# Altium integrated library micromouse library[Conflict].IntLib: 68 symbols (continued)
## MK20DX256VLH7_1
designator ?, comment MK20DX256VLH7
Kinetis K20: 72MHz Cortex-M4 Performance MCU, 288KB Flash, 64KB SRAM, Full-Speed USB, 64-LQFP; MF: NXP USA; Package: LQFP-64 NXP Semiconductors; Availability: Unavailable; MP: MK20DX256VLH7; SnapEDA_Link: https://www.snapeda.com/parts/MK20DX256VLH7/NXP%20USA%20Inc./view-part/?ref=snap; Price: None; Value: *
footprint QFP50P1200X1200X160-64N
pins: 1 D31/A20 (io), 2 D26/A15 (io), 3 VCC (io), 4 VSS (io), 5 USB-P (io), 6 USB-M (io), 7 VOUT3V3 (io), 8 VREGIN (io), 9 A11/ADC0_DP0 (io), 10 A10/ADC0_DM0 (io), 11 A12/ADC0_DP3 (io), 12 A13/ADC0_DM3 (io), 13 VCCA (io), 14 VREF-H (io), 15 VREF-L (io), 16 VSSA (io), 17 VREF_OUT (io), 18 A14/DAC (io), 19 XTAL32 (io), 20 EXTAL32 (io), 21 VBAT (io), 22 PTA0 (io), 23 PTA1 (io), 24 PTA2 (io), 25 PTA3 (io), 26 D33/PWM/TOUCH (io), 27 D24 (io), 28 D3/CAN-TX/PWM (io), 29 D4/CAN-RX/PWM (io), 30 VCC (io), 31 VSS (io), 32 OSC1 (io), 33 OSC2 (io), 34 RESET (io), 35 D16/A2/TOUCH (io), 36 D17/A3/TOUCH (io), 37 D19/A5/SCL0/TOUCH (io), 38 D18/A4/SDA0/TOUCH (io), 39 D0/RX1/TOUCH (io), 40 D1/TX1/TOUCH (io), 41 D32/PWM/TOUCH (io), 42 D25/PWM/TOUCH (io), 43 D15/A1/TOUCH (io), 44 D22/A8/PWM/TOUCH (io), 45 D23/A9/PWM/TOUCH (io), 46 D9/RX2/PWM (io), 47 VSS (io), 48 VCC (io), 49 D10/TX2/PWM (io), 50 D13/SCK/LED (io), 51 D11/MOSI (io), 52 D12/MISO (io), 53 D28/A17 (io), 54 D27/A16 (io), 55 D29/A18/SCL1 (io), 56 D30/A19/SDA1 (io), 57 D2 (io), 58 D14/A0 (io), 59 D7/RX3 (io), 60 D8/TX3 (io), 61 D6/PWM (io), 62 D20/A6/PWM (io), 63 D21/A7/PWM (io), 64 D5/PWM (io)

## MK64FX512VDC12
designator IC?
Integrated Circuit; Manufacturer_Name: Nexperia; Manufacturer_Part_Number: MK64FX512VDC12; Datasheet Link: https://www.nxp.com/docs/en/data-sheet/K64P144M120SF5.pdf; Height: 0.5mm; Mouser Part Number: 841-MK64FX512VDC12; Mouser Price/Stock: https://www.mouser.com/Search/Refine.aspx?Keyword=841-MK64FX512VDC12
footprint BGA121C65P11X11_800X800X50
pins: A1 PTD7, A2 PTD5, A3 PTD4/_LLWU_P14, A4 PTC19, A5 PTC14, A6 PTC13, A7 PTC8, A8 PTC4/_LLWU_P8, A9 PTD9, A10 PTD8, A11 NC_1, B1 PTD10, B2 PTD6/_LLWU_P15, B3 PTD3, B4 PTC18, B5 PTC15, B6 PTC12, B7 PTC7, B8 PTC3/_LLWU_P7, B9 PTC0, B10 PTB16, B11 PTB12, C1 PTD12, C2 PTD11, C3 PTD2/_LLWU_P13, C4 PTC17, C5 PTC11/_LLWU_P11, C6 PTC10, C7 PTC6/_LLWU_P10, C8 PTC2, C9 PTB19, C10 PTB11, C11 PTB13, D1 PTD14, D2 PTD13, D3 PTD1, D4 PTD0/_LLWU_P12, D5 PTC16, D6 PTC9, D7 PTC5/_LLWU_P9, D8 PTC1/_LLWU_P6, D9 PTB18, D10 PTB10, D11 PTB8, E1 PTD15, E2 PTE2/_LLWU_P1, E3 PTE1/_LLWU_P0, E4 PTE0, E5 VDD_1, E6 VDD_2, E7 VDD_3, E8 PTB23, E9 PTB17, E10 PTB9, E11 PTB7, F1 USB0_DP, F2 USB0_DM, F3 PTE6, F4 PTE3, F5 VDDA, F6 VSSA, F7 VSS_1, F8 PTB22, F9 PTB21, F10 PTB20, F11 PTB6, G1 VOUT33, G2 VREGIN, G3 VSS_2, G4 PTE5, G5 VREFH, G6 VREFL, G7 VSS_3, G8 PTB3, G9 PTB2, G10 PTB1, G11 PTB0/_LLWU_P5, H1 ADC0_DP1, H2 ADC0_DM1, H3 ADC0_SE16/_CMP1_IN2/_ADC0_SE21, H4 NC_2, H5 PTE24, H6 PTE26, H7 PTE4/_LLWU_P2, H8 PTA1, H9 PTA3, H10 PTA17, H11 PTA29, J1 ADC1_DP1, J2 ADC1_DM1, J3 ADC1_SE16/_CMP2_IN2/_ADC0_SE22, J4 PTA11, J5 PTE25, J6 PTA0, J7 PTA2, J8 PTA4/_LLWU_P3, J9 PTA10, J10 PTA16, J11 RESET_B, K1 ADC0_DP0/_ADC1_DP3, K2 ADC0_DM0/_ADC1_DM3, K3 NC_3, K4 DAC1_OUT/_CMP0_IN4/_CMP2_IN3/_ADC1_SE23, K5 DAC0_OUT/_CMP1_IN3/_ADC0_SE23, K6 VBAT, K7 PTA5, K8 PTA12, K9 PTA14, K10 VSS_4, K11 PTA19, L1 ADC1_DP0/_ADC0_DP3, L2 ADC1_DM0/_ADC0_DM3, L3 VREF_OUT/_CMP1_IN5/_CMP0_IN5/_ADC1_SE18, L4 XTAL32, L5 EXTAL32, L6 VSS_5, L7 RTC__WAKEUP_B, L8 PTA13/_LLWU_P4, L9 PTA15, L10 VDD_4, L11 PTA18

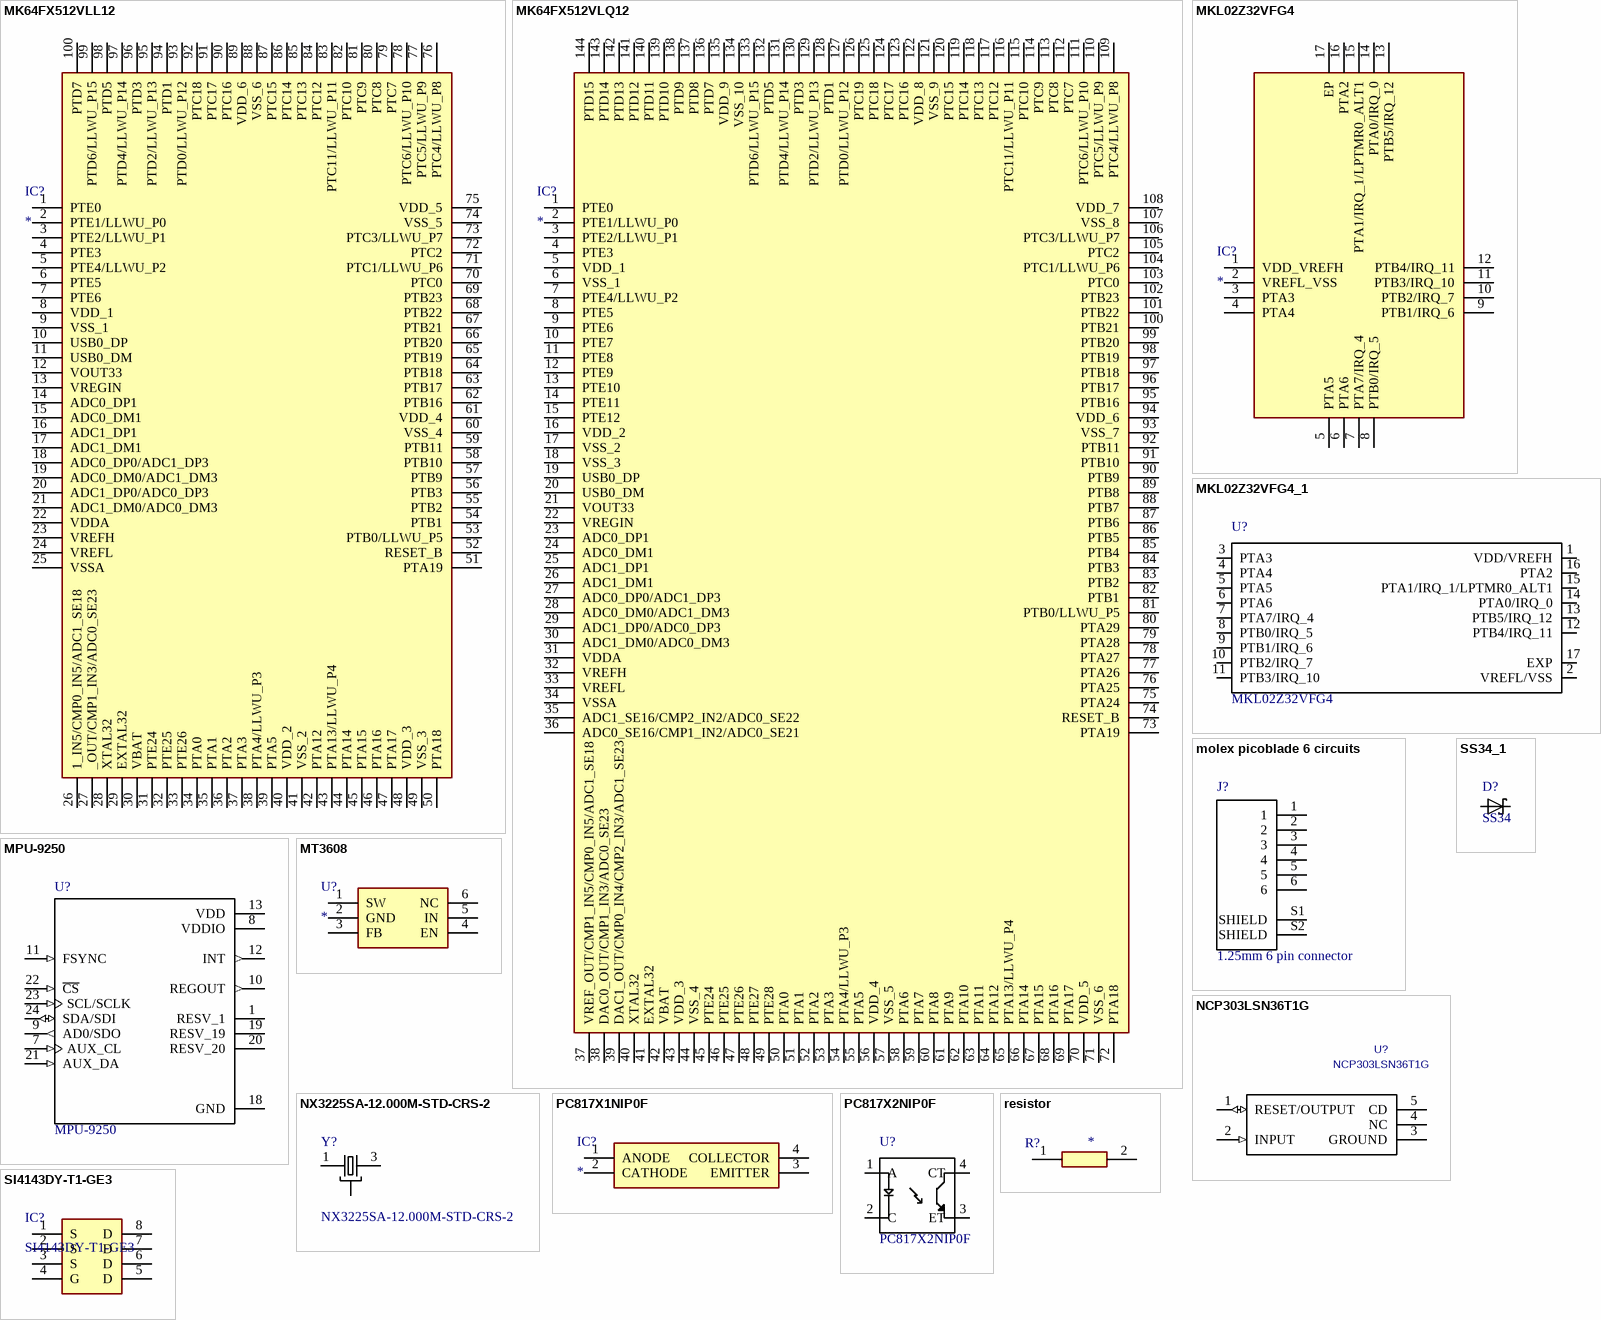
[diagram p2: symbols MK64FX512VLL12 to SS34_1]

## MK64FX512VLL12
designator IC?
Integrated Circuit; Manufacturer_Name: Nexperia; Manufacturer_Part_Number: MK64FX512VLL12; Datasheet Link: https://componentsearchengine.com/Datasheets/1/MK64FX512VLL12.pdf; Height: 1.7mm; Mouser Part Number: 841-MK64FX512VLL12; Mouser Price/Stock: https://www.mouser.com/Search/Refine.aspx?Keyword=841-MK64FX512VLL12
footprint QFP50P1600X1600X170-100N
pins: 1 PTE0, 2 PTE1/LLWU_P0, 3 PTE2/LLWU_P1, 4 PTE3, 5 PTE4/LLWU_P2, 6 PTE5, 7 PTE6, 8 VDD_1, 9 VSS_1, 10 USB0_DP, 11 USB0_DM, 12 VOUT33, 13 VREGIN, 14 ADC0_DP1, 15 ADC0_DM1, 16 ADC1_DP1, 17 ADC1_DM1, 18 ADC0_DP0/ADC1_DP3, 19 ADC0_DM0/ADC1_DM3, 20 ADC1_DP0/ADC0_DP3, 21 ADC1_DM0/ADC0_DM3, 22 VDDA, 23 VREFH, 24 VREFL, 25 VSSA, 26 1_IN5/CMP0_IN5/ADC1_SE18, 27 _OUT/CMP1_IN3/ADC0_SE23, 28 XTAL32, 29 EXTAL32, 30 VBAT, 31 PTE24, 32 PTE25, 33 PTE26, 34 PTA0, 35 PTA1, 36 PTA2, 37 PTA3, 38 PTA4/LLWU_P3, 39 PTA5, 40 VDD_2, 41 VSS_2, 42 PTA12, 43 PTA13/LLWU_P4, 44 PTA14, 45 PTA15, 46 PTA16, 47 PTA17, 48 VDD_3, 49 VSS_3, 50 PTA18, 51 PTA19, 52 RESET_B, 53 PTB0/LLWU_P5, 54 PTB1, 55 PTB2, 56 PTB3, 57 PTB9, 58 PTB10, 59 PTB11, 60 VSS_4, 61 VDD_4, 62 PTB16, 63 PTB17, 64 PTB18, 65 PTB19, 66 PTB20, 67 PTB21, 68 PTB22, 69 PTB23, 70 PTC0, 71 PTC1/LLWU_P6, 72 PTC2, 73 PTC3/LLWU_P7, 74 VSS_5, 75 VDD_5, 76 PTC4/LLWU_P8, 77 PTC5/LLWU_P9, 78 PTC6/LLWU_P10, 79 PTC7, 80 PTC8, 81 PTC9, 82 PTC10, 83 PTC11/LLWU_P11, 84 PTC12, 85 PTC13, 86 PTC14, 87 PTC15, 88 VSS_6, 89 VDD_6, 90 PTC16, 91 PTC17, 92 PTC18, 93 PTD0/LLWU_P12, 94 PTD1, 95 PTD2/LLWU_P13, 96 PTD3, 97 PTD4/LLWU_P14, 98 PTD5, 99 PTD6/LLWU_P15, 100 PTD7

## MK64FX512VLQ12
designator IC?
Integrated Circuit; Manufacturer_Name: Nexperia; Manufacturer_Part_Number: MK64FX512VLQ12; Datasheet Link: https://www.nxp.com/docs/en/data-sheet/K64P144M120SF5.pdf; Height: 1.6mm; Mouser Part Number: 841-MK64FX512VLQ12; Mouser Price/Stock: https://www.mouser.com/Search/Refine.aspx?Keyword=841-MK64FX512VLQ12
footprint QFP50P2200X2200X160-144N
pins: 1 PTE0, 2 PTE1/LLWU_P0, 3 PTE2/LLWU_P1, 4 PTE3, 5 VDD_1, 6 VSS_1, 7 PTE4/LLWU_P2, 8 PTE5, 9 PTE6, 10 PTE7, 11 PTE8, 12 PTE9, 13 PTE10, 14 PTE11, 15 PTE12, 16 VDD_2, 17 VSS_2, 18 VSS_3, 19 USB0_DP, 20 USB0_DM, 21 VOUT33, 22 VREGIN, 23 ADC0_DP1, 24 ADC0_DM1, 25 ADC1_DP1, 26 ADC1_DM1, 27 ADC0_DP0/ADC1_DP3, 28 ADC0_DM0/ADC1_DM3, 29 ADC1_DP0/ADC0_DP3, 30 ADC1_DM0/ADC0_DM3, 31 VDDA, 32 VREFH, 33 VREFL, 34 VSSA, 35 ADC1_SE16/CMP2_IN2/ADC0_SE22, 36 ADC0_SE16/CMP1_IN2/ADC0_SE21, 37 VREF_OUT/CMP1_IN5/CMP0_IN5/ADC1_SE18, 38 DAC0_OUT/CMP1_IN3/ADC0_SE23, 39 DAC1_OUT/CMP0_IN4/CMP2_IN3/ADC1_SE23, 40 XTAL32, 41 EXTAL32, 42 VBAT, 43 VDD_3, 44 VSS_4, 45 PTE24, 46 PTE25, 47 PTE26, 48 PTE27, 49 PTE28, 50 PTA0, 51 PTA1, 52 PTA2, 53 PTA3, 54 PTA4/LLWU_P3, 55 PTA5, 56 VDD_4, 57 VSS_5, 58 PTA6, 59 PTA7, 60 PTA8, 61 PTA9, 62 PTA10, 63 PTA11, 64 PTA12, 65 PTA13/LLWU_P4, 66 PTA14, 67 PTA15, 68 PTA16, 69 PTA17, 70 VDD_5, 71 VSS_6, 72 PTA18, 73 PTA19, 74 RESET_B, 75 PTA24, 76 PTA25, 77 PTA26, 78 PTA27, 79 PTA28, 80 PTA29, 81 PTB0/LLWU_P5, 82 PTB1, 83 PTB2, 84 PTB3, 85 PTB4, 86 PTB5, 87 PTB6, 88 PTB7, 89 PTB8, 90 PTB9, 91 PTB10, 92 PTB11, 93 VSS_7, 94 VDD_6, 95 PTB16, 96 PTB17, 97 PTB18, 98 PTB19, 99 PTB20, 100 PTB21, 101 PTB22, 102 PTB23, 103 PTC0, 104 PTC1/LLWU_P6, 105 PTC2, 106 PTC3/LLWU_P7, 107 VSS_8, 108 VDD_7, 109 PTC4/LLWU_P8, 110 PTC5/LLWU_P9, 111 PTC6/LLWU_P10, 112 PTC7, 113 PTC8, 114 PTC9, 115 PTC10, 116 PTC11/LLWU_P11, 117 PTC12, 118 PTC13, 119 PTC14, 120 PTC15, 121 VSS_9, 122 VDD_8, 123 PTC16, 124 PTC17, 125 PTC18, 126 PTC19, 127 PTD0/LLWU_P12, 128 PTD1, 129 PTD2/LLWU_P13, 130 PTD3, 131 PTD4/LLWU_P14, 132 PTD5, 133 PTD6/LLWU_P15, 134 VSS_10, 135 VDD_9, 136 PTD7, 137 PTD8, 138 PTD9, 139 PTD10, 140 PTD11, 141 PTD12, 142 PTD13, 143 PTD14, 144 PTD15

## MKL02Z32VFG4
designator IC?
Integrated Circuit; Manufacturer_Name: Nexperia; Manufacturer_Part_Number: MKL02Z32VFG4; Datasheet Link: https://www.nxp.com/docs/en/data-sheet/KL02P32M48SF0.pdf; Height: 0.65mm; Mouser Part Number: 841-MKL02Z32VFG4; Mouser Price/Stock: https://www.mouser.com/Search/Refine.aspx?Keyword=841-MKL02Z32VFG4; RS Part Number: 7884723P; RS Price/Stock: http://uk.rs-online.com/web/p/products/7884723P
footprint QFN50P300X300X65-17N-D
pins: 1 VDD_VREFH, 2 VREFL_VSS, 3 PTA3, 4 PTA4, 5 PTA5, 6 PTA6, 7 PTA7/IRQ_4, 8 PTB0/IRQ_5, 9 PTB1/IRQ_6, 10 PTB2/IRQ_7, 11 PTB3/IRQ_10, 12 PTB4/IRQ_11, 13 PTB5/IRQ_12, 14 PTA0/IRQ_0, 15 PTA1/IRQ_1/LPTMR0_ALT1, 16 PTA2, 17 EP

## MKL02Z32VFG4_1
designator U?, comment MKL02Z32VFG4
32 Bit Microcontroller, Kinetis L Series Ultra Low Power, ARM Cortex-M0+, 48 MHz, 32 KB, 4 KB, 16; MF: NXP USA; Package: QFN-16 NXP Semiconductors; Availability: Unavailable; MP: MKL02Z32VFG4; SnapEDA_Link: https://www.snapeda.com/parts/MKL02Z32VFG4/NXP%20USA%20Inc./view-part/?ref=snap; Price: None; Value: *
footprint *QFN50P300X300X65-17N
pins: 1 VDD/VREFH (power), 2 VREFL/VSS (power), 3 PTA3 (io), 4 PTA4 (io), 5 PTA5 (io), 6 PTA6 (io), 7 PTA7/IRQ_4 (io), 8 PTB0/IRQ_5 (io), 9 PTB1/IRQ_6 (io), 10 PTB2/IRQ_7 (io), 11 PTB3/IRQ_10 (io), 12 PTB4/IRQ_11 (io), 13 PTB5/IRQ_12 (io), 14 PTA0/IRQ_0 (io), 15 PTA1/IRQ_1/LPTMR0_ALT1 (io), 16 PTA2 (io), 17 EXP (power)

## molex picoblade 6 circuits
designator J?, comment 1.25mm 6 pin connector
1.25mm _.049_ Pitch PicoBlade Header, Surface Mount, Right Angle, Lead-free, 6 Circuits; MP: 0532610671; MF: Molex; SnapEDA_Link: https://www.snapeda.com/parts/0532610671/Molex/view-part/?ref=snap; Price: None; Package: None; Availability: Unavailable; Value: *
footprint *MOLEX_0532610671_0532610671(Primary)
pins: 1, 2, 3, 4, 5, 6, S1 SHIELD, S2 SHIELD

## MPU-9250
designator U?
IMUs - Inertial Measurement Units RECOMMENDED ALT 410-ICM-20948; MF: TDK InvenSense; Package: TFQFN-24 TDK InvenSense; Availability: Unavailable; MP: MPU-9250; SnapEDA_Link: https://www.snapeda.com/parts/MPU-9250/TDK%20InvenSense/view-part/?ref=snap; Price: None; Value: *
footprint *QFN40P300X300X105-24N
pins: 1 RESV_1, 7 AUX_CL (in), 8 VDDIO (power), 9 AD0/SDO (out), 10 REGOUT (out), 11 FSYNC (in), 12 INT (out), 13 VDD (power), 18 GND (power), 19 RESV_19, 20 RESV_20, 21 AUX_DA (in), 22 ~{CS} (in), 23 SCL/SCLK (in), 24 SDA/SDI (io)

## MT3608
designator U?
Undefined or Miscellaneous; Manufacturer_Name: Aerosemi; Manufacturer_Part_Number: MT3608; Datasheet Link: https://www.olimex.com/Products/Breadboarding/BB-PWR-3608/resources/MT3608.pdf; Height: 1.45mm
footprint SOT95P280X145-6N
pins: 1 SW, 2 GND, 3 FB, 4 EN, 5 IN, 6 NC

## NCP303LSN36T1G
designator U?
C: Copyright (C) 2016 Accelerated Designs. All rights reserved; Vendor: ON Semiconductor; Value: NCP303LSN36T1G; Manufacturer_Part_Number: NCP303LSN36T1G; Copyright: Copyright (C) 2016 Accelerated Designs. All rights reserved
footprint TSOP-5
pins: 1 RESET/OUTPUT (io), 2 INPUT (in), 3 GROUND (power), 4 NC, 5 CD

## NX3225SA-12.000M-STD-CRS-2
designator Y?
Crystal 12.0000mhz 8pf Smd; MF: NDK America,; MP: NX3225SA-12.000M-STD-CRS-2; Price: None; SnapEDA_Link: https://www.snapeda.com/parts/NX3225SA-12.000M-STD-CRS-2/NDK%20America%2C%20Inc./view-part/?ref=snap; Availability: Unavailable; Package: SMD-4 NDK America; Value: *
footprint *OSCCC320X250X60N
pins: 1, 2 GND, 3, 4 GND

## PC817X1NIP0F
designator IC?
Integrated Circuit; Manufacturer_Name: Sharp Microelectronics; Manufacturer_Part_Number: PC817X1NIP0F; Datasheet Link: http://docs-emea.rs-online.com/webdocs/1327/0900766b81327ad8.pdf; Height: 4mm; Mouser Part Number: N/A; Mouser Price/Stock: https://www.mouser.com/Search/Refine.aspx?Keyword=N%2FA; RS Part Number: 8264647P; RS Price/Stock: http://uk.rs-online.com/web/p/products/8264647P
footprint SOP254P975X400-4N
pins: 1 ANODE, 2 CATHODE, 3 EMITTER, 4 COLLECTOR

## PC817X2NIP0F
designator U?
Optocoupler DC-IN 1-CH Transistor DC-OUT 4-Pin PDIP SMD; MF: Sharp Microelectronics; Package: SMD-4 Sharp; Price: None; SnapEDA_Link: https://www.snapeda.com/parts/PC817X2NIP0F/Sharp%20Microelectronics/view-part/?ref=snap; MP: PC817X2NIP0F; Availability: Unavailable; Value: *
footprint *SOT254P975X400-4N
pins: 1 A, 2 C, 3 ET, 4 CT

## resistor
designator R?
Resistor; value: *
footprint RESC1608X55N
pins: 1, 2

## SI4143DY-T1-GE3
designator IC?
Integrated Circuit
footprint SI4143DY-T1-GE3
pins: 1 S, 2 S, 3 S, 4 G, 5 D, 6 D, 7 D, 8 D (power)

## SS34_1
designator D?, comment SS34
Diode Schottky 40V 3A 2-Pin SMC T/R; MF: ON Semiconductor; MP: SS34; SnapEDA_Link: https://www.snapeda.com/parts/SS34/ON%20Semiconductor/view-part/?ref=snap; Price: None; Package: DO-214AB-214 ON Semiconductor; Availability: Unavailable; Value: *
footprint *SMA
pins: A, C

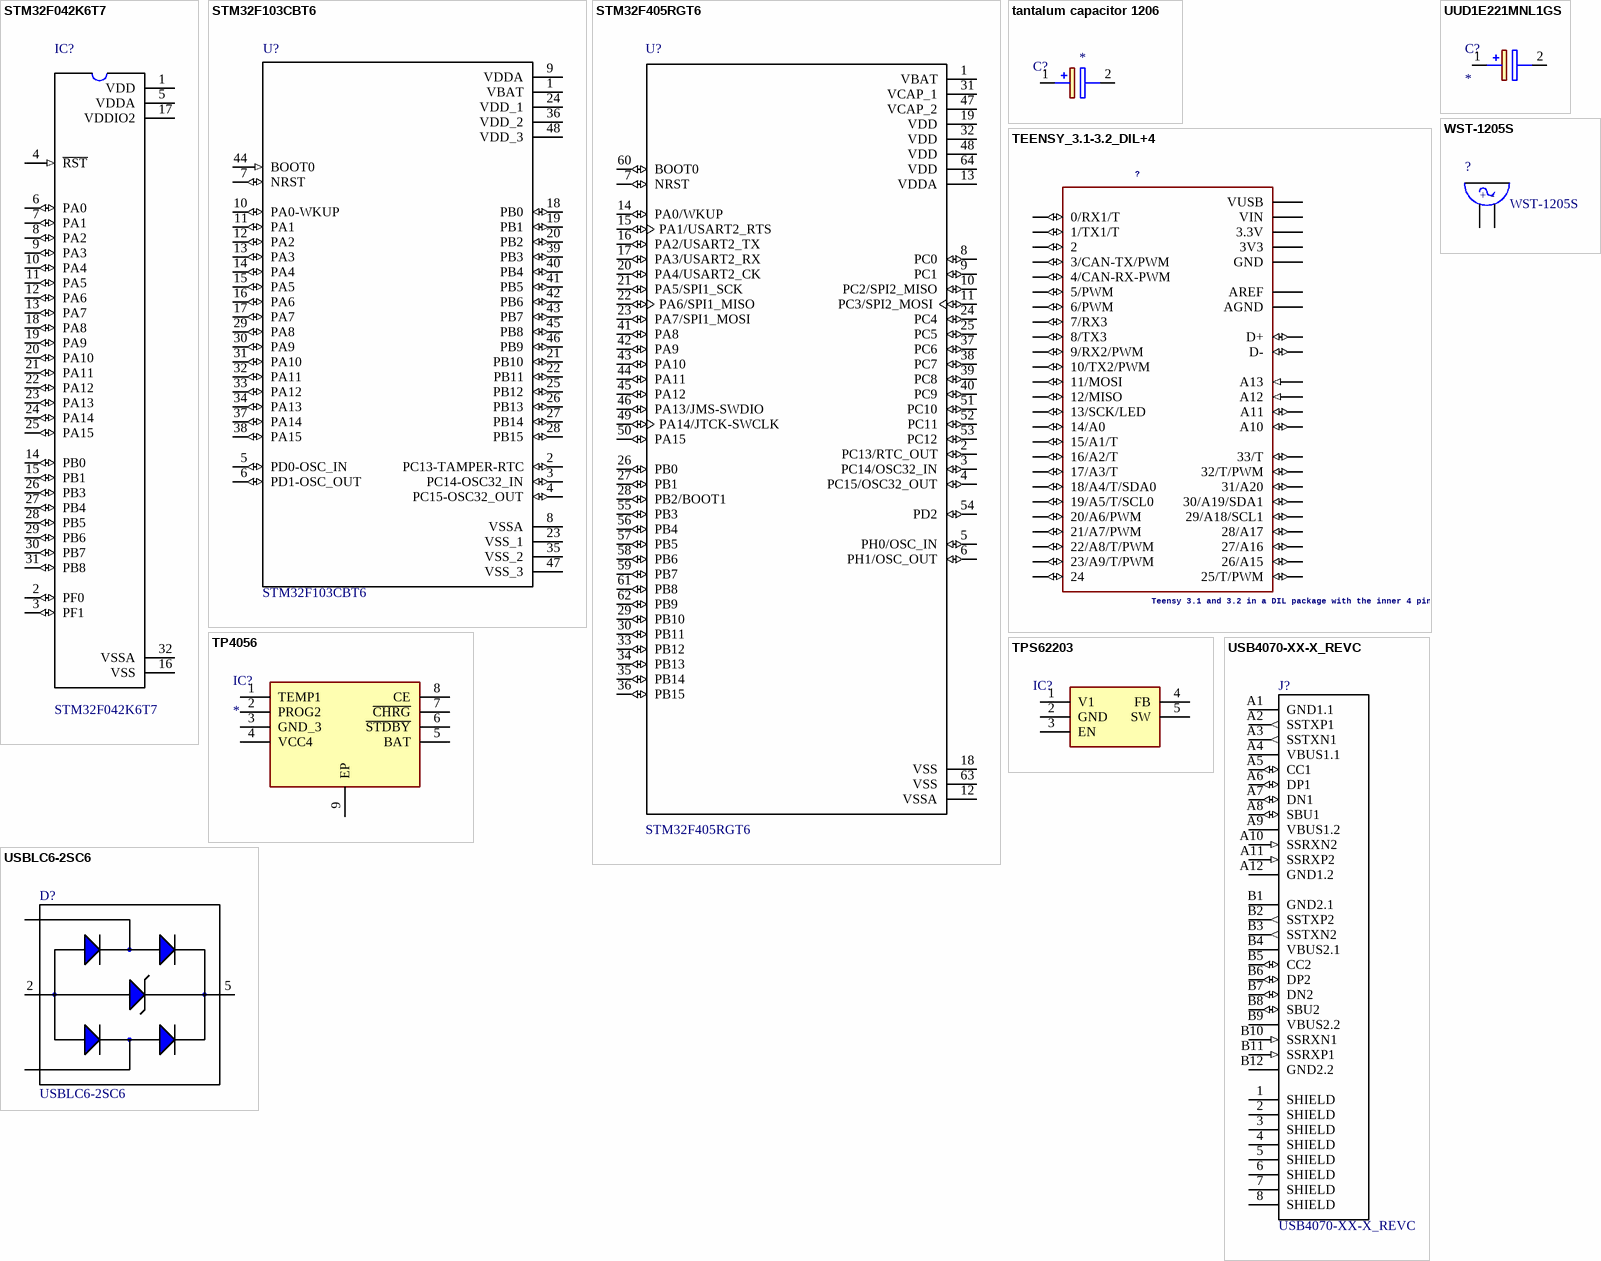
[diagram p3: symbols STM32F042K6T7 to WST-1205S]

## STM32F042K6T7
designator IC?
Entry-level ARM Cortex-M0 USB line MCU with 32 Kbytes Flash, 48 MHz CPU, USB, CAN and CEC functions; MF: STMicroelectronics; MP: STM32F042K6T7; Package: LQFP-32 STMicroelectronics; SnapEDA_Link: https://www.snapeda.com/parts/STM32F042K6T7/STMicroelectronics/view-part/?ref=snap; Price: None; Availability: Unavailable; Value: *
footprint *QFP80P900X900X160-32N
pins: 1 VDD (power), 2 PF0 (io), 3 PF1 (io), 4 ~{RST} (in), 5 VDDA (power), 6 PA0 (io), 7 PA1 (io), 8 PA2 (io), 9 PA3 (io), 10 PA4 (io), 11 PA5 (io), 12 PA6 (io), 13 PA7 (io), 14 PB0 (io), 15 PB1 (io), 16 VSS, 17 VDDIO2 (power), 18 PA8 (io), 19 PA9 (io), 20 PA10 (io), 21 PA11 (io), 22 PA12 (io), 23 PA13 (io), 24 PA14 (io), 25 PA15 (io), 26 PB3 (io), 27 PB4 (io), 28 PB5 (io), 29 PB6 (io), 30 PB7 (io), 31 PB8 (io), 32 VSSA

## STM32F103CBT6
designator U?
Mainstream Performance line, ARM Cortex-M3 MCU with 128 Kbytes Flash, 72 MHz CPU, motor control, USB and CAN; MF: STMicroelectronics; MP: STM32F103CBT6; Price: None; SnapEDA_Link: https://www.snapeda.com/parts/STM32F103CBT6/STMicroelectronics/view-part/?ref=snap; Availability: Unavailable; Package: LQFP-48 STMicroelectronics; Value: *
footprint *QFP50P900X900X160-48N
pins: 1 VBAT (power), 2 PC13-TAMPER-RTC (io), 3 PC14-OSC32_IN (io), 4 PC15-OSC32_OUT (io), 5 PD0-OSC_IN (io), 6 PD1-OSC_OUT (io), 7 NRST (io), 8 VSSA (power), 9 VDDA (power), 10 PA0-WKUP (io), 11 PA1 (io), 12 PA2 (io), 13 PA3 (io), 14 PA4 (io), 15 PA5 (io), 16 PA6 (io), 17 PA7 (io), 18 PB0 (io), 19 PB1 (io), 20 PB2 (io), 21 PB10 (io), 22 PB11 (io), 23 VSS_1 (power), 24 VDD_1 (power), 25 PB12 (io), 26 PB13 (io), 27 PB14 (io), 28 PB15 (io), 29 PA8 (io), 30 PA9 (io), 31 PA10 (io), 32 PA11 (io), 33 PA12 (io), 34 PA13 (io), 35 VSS_2 (power), 36 VDD_2 (power), 37 PA14 (io), 38 PA15 (io), 39 PB3 (io), 40 PB4 (io), 41 PB5 (io), 42 PB6 (io), 43 PB7 (io), 44 BOOT0 (in), 45 PB8 (io), 46 PB9 (io), 47 VSS_3 (power), 48 VDD_3 (power)

## STM32F405RGT6
designator U?
High-performance foundation line, ARM Cortex-M4 core with DSP and FPU, 1 Mbyte Flash, 168 MHz CPU, ART Accelerator; MF: STMicroelectronics; MP: STM32F405RGT6; Price: None; SnapEDA_Link: https://www.snapeda.com/parts/STM32F405RGT6/STMicroelectronics/view-part/?ref=snap; Availability: Unavailable; Package: LQFP-64 STMicroelectronics; Value: *
footprint *QFP50P1200X1200X160-64N
pins: 1 VBAT (power), 2 PC13/RTC_OUT (io), 3 PC14/OSC32_IN (io), 4 PC15/OSC32_OUT (io), 5 PH0/OSC_IN (io), 6 PH1/OSC_OUT (io), 7 NRST (io), 8 PC0 (io), 9 PC1 (io), 10 PC2/SPI2_MISO (io), 11 PC3/SPI2_MOSI (io), 12 VSSA (power), 13 VDDA (power), 14 PA0/WKUP (io), 15 PA1/USART2_RTS (io), 16 PA2/USART2_TX (io), 17 PA3/USART2_RX (io), 18 VSS (power), 19 VDD (power), 20 PA4/USART2_CK (io), 21 PA5/SPI1_SCK (io), 22 PA6/SPI1_MISO (io), 23 PA7/SPI1_MOSI (io), 24 PC4 (io), 25 PC5 (io), 26 PB0 (io), 27 PB1 (io), 28 PB2/BOOT1 (io), 29 PB10 (io), 30 PB11 (io), 31 VCAP_1 (power), 32 VDD (power), 33 PB12 (io), 34 PB13 (io), 35 PB14 (io), 36 PB15 (io), 37 PC6 (io), 38 PC7 (io), 39 PC8 (io), 40 PC9 (io), 41 PA8 (io), 42 PA9 (io), 43 PA10 (io), 44 PA11 (io), 45 PA12 (io), 46 PA13/JMS-SWDIO (io), 47 VCAP_2 (power), 48 VDD (power), 49 PA14/JTCK-SWCLK (io), 50 PA15 (io), 51 PC10 (io), 52 PC11 (io), 53 PC12 (io), 54 PD2 (io), 55 PB3 (io), 56 PB4 (io), 57 PB5 (io), 58 PB6 (io), 59 PB7 (io), 60 BOOT0 (io), 61 PB8 (io), 62 PB9 (io), 63 VSS (power), 64 VDD (power)

## tantalum capacitor 1206
designator C?
Capacitor Polarised; value: *
footprint CAPPM3216X180N
pins: 1 +, 2 -

## TEENSY_3.1-3.2_DIL+4
designator ?, comment Teensy 3.1 and 3.2 in a DIL package with the inner 4 pins
GateName_1: G$1; SymbolName_1: TEENSY_3.1-3.2_DIL+4; LibraryName: Teensy_3_and_LC_Series_Boards_v1.4; DeviceSetName: TEENSY_3.1-3.2_DIL+4; Package: TEENSY_3.0-3.2&LC_DIL+4
footprint TEENSY_3.0-3.2&LC_DIL+4
pins: 0 0/RX1/T (io), 1 1/TX1/T (io), 2 (io), 3 3/CAN-TX/PWM (io), 3.3V (power), 3V 3V3 (power), 4 4/CAN-RX-PWM (io), 5 5/PWM (io), 6 6/PWM (io), 7 7/RX3 (io), 8 8/TX3 (io), 9 9/RX2/PWM (io), 10 10/TX2/PWM (io), 11 11/MOSI (io), 12 12/MISO (io), 13 13/SCK/LED (io), 14/A0 (io), 15/A1 15/A1/T (io), 16/A2 16/A2/T (io), 17/A3 17/A3/T (io), 18/A4 18/A4/T/SDA0 (io), 19/A5 19/A5/T/SCL0 (io), 20/A6 20/A6/PWM (io), 21/A7 21/A7/PWM (io), 22/A8 22/A8/T/PWM (io), 23/A9 23/A9/T/PWM (io), 24 (io), 25 25/T/PWM (io), 26 26/A15 (io), 27 27/A16 (io), 28 28/A17 (io), 29 29/A18/SCL1 (io), 30 30/A19/SDA1 (io), 31 31/A20 (io), 32 32/T/PWM (io), 33 33/T (io), A10 (io), A11 (io), A12 (in), A13 (in), AGND (power), AREF (power), D+ (io), D- (io), GND (power), VIN (power), VUSB (power)

## TP4056
designator IC?
Integrated Circuit; Manufacturer_Name: NanJing Top Power; Manufacturer_Part_Number: TP4056; Datasheet Link: https://dlnmh9ip6v2uc.cloudfront.net/datasheets/Prototyping/TP4056.pdf; Height: 1.75mm
footprint SOIC127P600X175-9N
pins: 1 TEMP1, 2 PROG2, 3 GND_3, 4 VCC4, 5 BAT, 6 ~{STDBY}, 7 ~{CHRG}, 8 CE, 9 EP

## TPS62203
designator IC?  (value not drawn)
Integrated Circuit
footprint SOT95P280X145-5N
pins: 1 V1, 2 GND, 3 EN, 4 FB, 5 SW

## USB4070-XX-X_REVC
designator J?
Usb Type c Rec. 30 , Vertical, Smt With Stakes & Pegs, Tray; MP: USB4070-30-B; MF: Global Connector Technology; SnapEDA_Link: https://www.snapeda.com/parts/USB4070-30-B/Global%20Connector%20Technology/view-part/?ref=snap; Package: None; Price: None; Availability: Unavailable; Value: *
footprint *GCT_USB4070-XX-X_REVC_USB4070-XX-X_REVC(Primary)
pins: 1 SHIELD, 2 SHIELD, 3 SHIELD, 4 SHIELD, 5 SHIELD, 6 SHIELD, 7 SHIELD, 8 SHIELD, A1 GND1.1 (power), A2 SSTXP1 (out), A3 SSTXN1 (out), A4 VBUS1.1 (power), A5 CC1 (io), A6 DP1 (io), A7 DN1 (io), A8 SBU1 (io), A9 VBUS1.2 (power), A10 SSRXN2 (in), A11 SSRXP2 (in), A12 GND1.2 (power), B1 GND2.1 (power), B2 SSTXP2 (out), B3 SSTXN2 (out), B4 VBUS2.1 (power), B5 CC2 (io), B6 DP2 (io), B7 DN2 (io), B8 SBU2 (io), B9 VBUS2.2 (power), B10 SSRXN1 (in), B11 SSRXP1 (in), B12 GND2.2 (power)

## USBLC6-2SC6
designator D?
USBLC6 Series 2 Line 6 V Uni / Bi-Directional ESD Protection - SOT-23-6; MF: STMicroelectronics; Package: SOT-23-6 STMicroelectronics; Price: None; SnapEDA_Link: https://www.snapeda.com/parts/USBLC6-2SC6/STMicroelectronics/view-part/?ref=snap; MP: USBLC6-2SC6; Availability: Unavailable; Value: *
footprint *SOT95P280X145-6N
pins: 1 I/O1 (io), 2 GND (power), 3 I/O2 (io), 4 I/O2 (io), 5 VBUS (power), 6 I/O1 (io)

## UUD1E221MNL1GS
designator C?
Capacitor Polarised; Manufacturer_Name: Nichicon; Manufacturer_Part_Number: UUD1E221MNL1GS; Allied_Number: 70409814; Datasheet Link: https://www.mouser.com/datasheet/2/293/e-uud-1513238.pdf; Height: 10.5mm; Mouser1 Part Number: 647-UUD1E221MNL; Mouser1 Price/Stock: https://www.mouser.com/Search/Refine.aspx?Keyword=647-UUD1E221MNL; RS Part Number: 7393453P; RS Price/Stock: http://uk.rs-online.com/web/p/products/7393453P; Allied Price/Stock: https://www.alliedelec.com/nichicon-uud1e221mnl1gs/70409814/
footprint CAPAE830X1050N
pins: 1 +, 2 -

## WST-1205S
designator ?
Buzzer 2.3khz 4-6vdc Pcb Wash; MF: Soberton Inc.; Price: None; Package: Soberton Inc.; MP: WST-1205S; Availability: Unavailable; SnapEDA_Link: https://www.snapeda.com/parts/WST-1205S/Soberton%20Inc./view-part/?ref=snap; Value: *
footprint *WST-1205S_WST-1205S(Primary)
pins: NEG 2, POS 1
text: +; -